# Altium footprint library 六角铜柱.PcbLib: 49 footprints (part 4 of 4)
Each footprint in its own frame and in the unit in brackets; x right, y up, seen from the top. Pads: shape width x height; smd on the part's side, far side on the other; paste and mask are expansions set on the pad; w line width, h text height; cw(c..) or ccw(c..) is an arc to the next point about the centre after c.
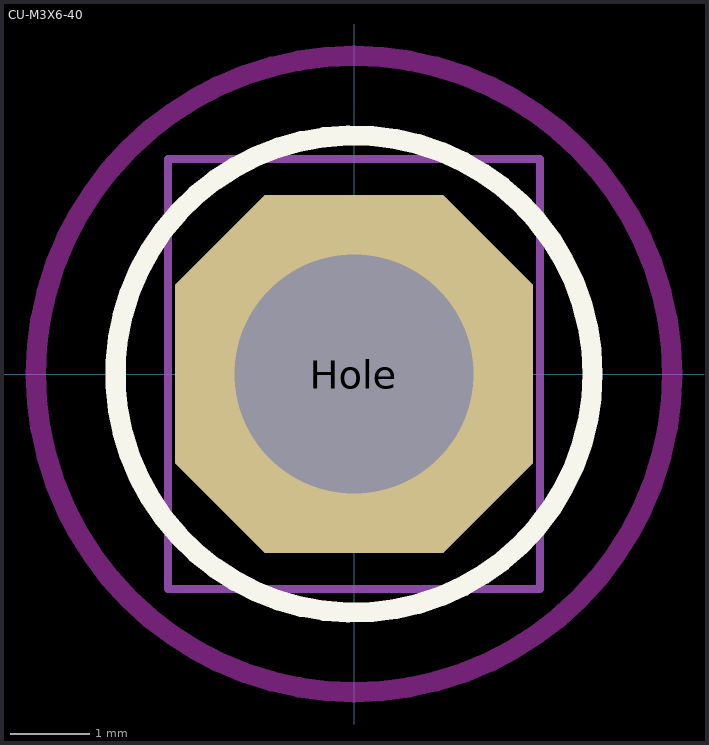
[diagram p3: the footprint, top view; thin cyan lines are the x and y axes]

## CU-M3X6-40 [mm] "40mm长M3六角铜柱"
height 40
pads (1):
  oct 4.5x4.5 hole 3: Hole(0,0)
Top Overlay:
  circle w0.254: c0,0 r3
Keep-Out Layer:
  circle w0.254: c0,0 r4
Mechanical 1:
  circle w0.15: c0,0 r1.5
Mechanical 13:
  lines w0.1: -2.34,-2.702 -2.34,2.702 2.34,2.702 2.34,-2.702 -2.34,-2.702
Mechanical 15:
  lines w0.1: -1,0 1,0 ; 0,-1 0,1
3D body: height 40, standoff -6, extent -2.34,-2.702 2.34,2.702